# Altium footprint library ACTION_Connector.PcbLib: 123 footprints (part 2 of 8)
Each footprint in its own frame and in the unit in brackets; x right, y up, seen from the top. Pads: shape width x height; smd on the part's side, far side on the other; paste and mask are expansions set on the pad; w line width, h text height; cw(c..) or ccw(c..) is an arc to the next point about the centre after c.
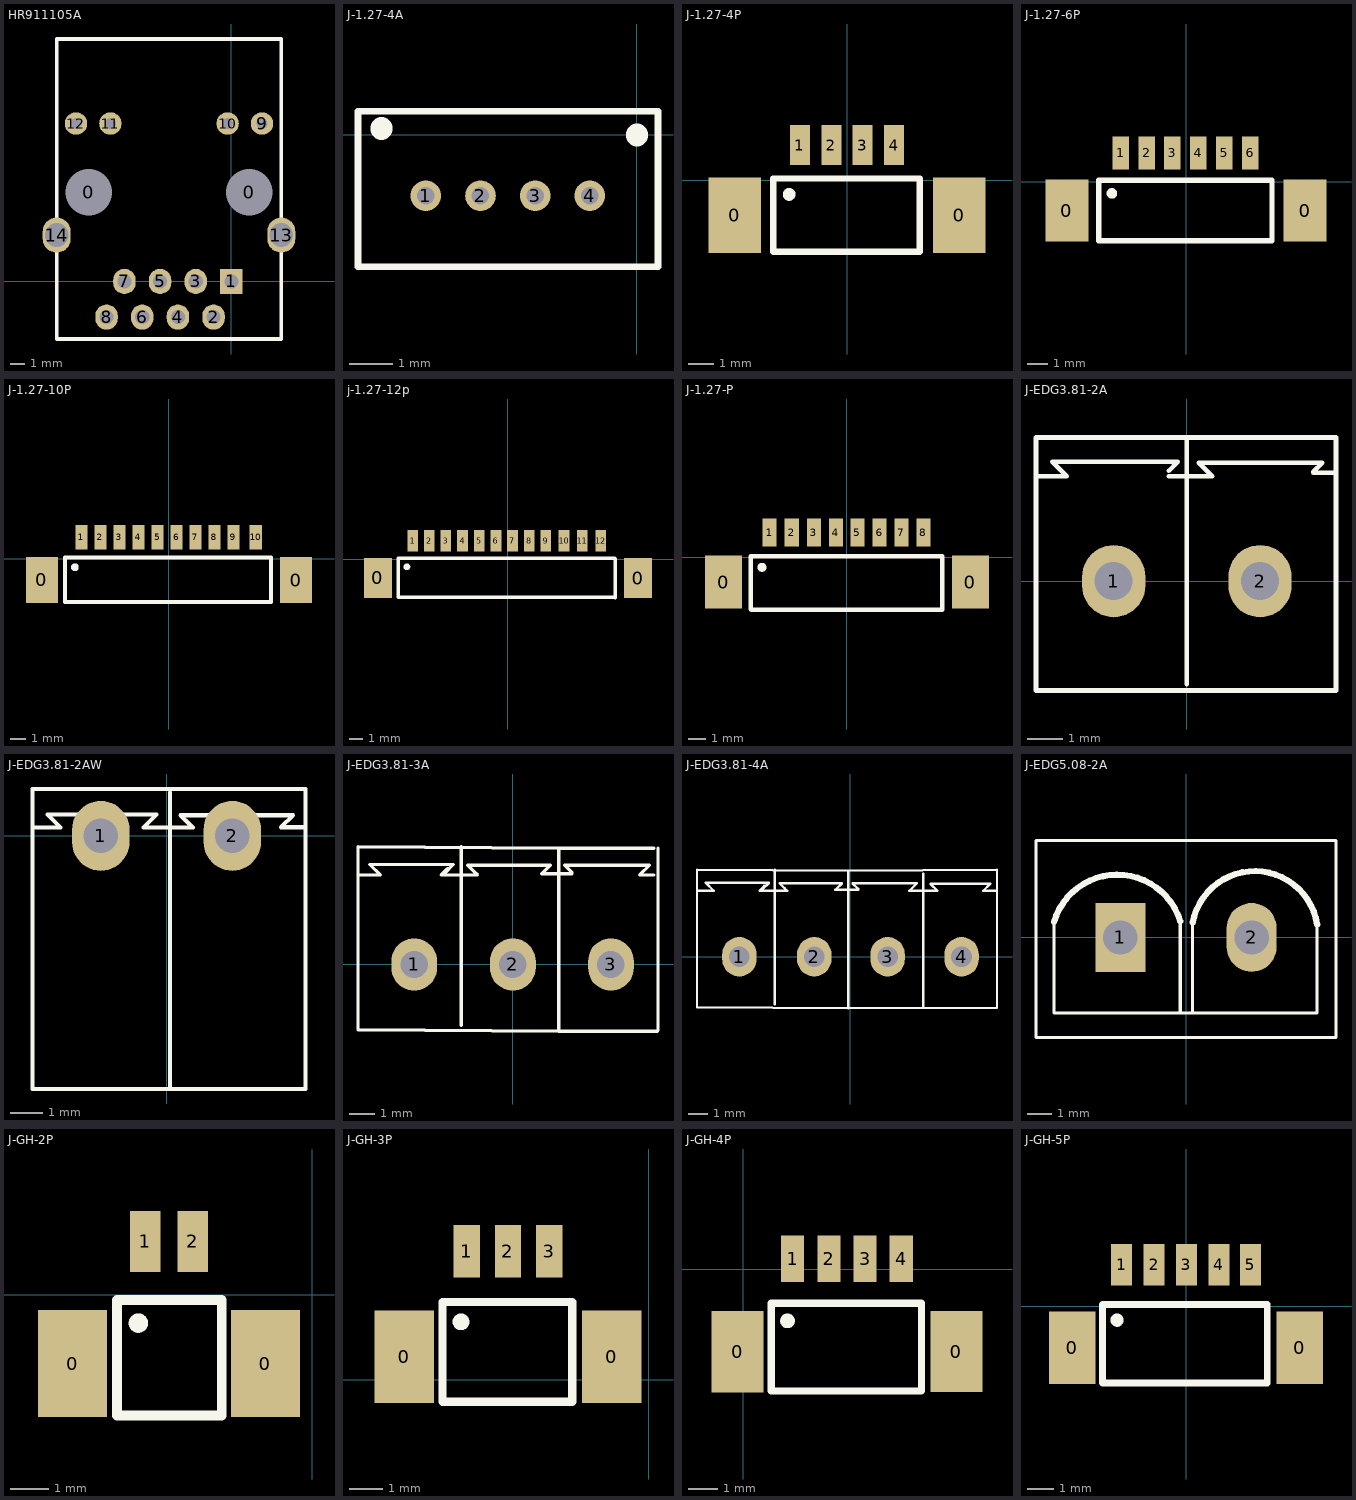
[diagram p1: the footprints below, top view; thin cyan lines are the x and y axes]

## HR911105A [mm]
pads (16):
  round 3.2 hole 3.3: 0(-10.16,6.35) 0(1.27,6.35)
  rect 1.6x1.8 hole 1: 1(0,0)
  oval 1.6x1.8 hole 1: 2(-1.27,-2.54) 3(-2.54,0) 4(-3.81,-2.54) 5(-5.08,0) 6(-6.35,-2.54) 7(-7.62,0) 8(-8.89,-2.54)
  round 1.6 hole 0.8: 9(2.18,11.25) 10(-0.27,11.25) 11(-8.62,11.25) 12(-11.07,11.25)
  oval 2x2.5 hole 1.7: 13(3.555,3.3) 14(-12.445,3.3)
Top Overlay:
  lines w0.254: 3.555,14.4 3.555,-4.1 ; -12.445,-4.1 3.555,-4.1 ; -12.445,-4.1 -12.445,14.4 -12.445,17.27 ; -12.445,-4.1 -12.445,17.27 ; -12.445,17.27 3.555,17.27 3.555,-4.1
3D body "HR911105A.STEP": height 2.53, standoff -13.97, extent -12.324,-4.223 3.556,17.177

## J-1.27-4A [mm]
pads (4):
  round 0.7 hole 0.4: 1(-4.826,-1.397) 2(-3.576,-1.397) 3(-2.326,-1.397) 4(-1.076,-1.397)
Top Overlay:
  lines w0.152: -6.375,-3.023 -6.375,0.533 0.483,0.533 0.483,-3.023 -6.375,-3.023
  lines w0.5: -5.842,0.127 -5.842,0.152 ; 0,-0.025 0,0

## J-1.27-4P [mm]
height 0.6
pads (6):
  rect 2.1x3 smd: 0(-4.475,-1.401) 0(4.475,-1.401)
  rect 0.8x1.6 smd: 1(-1.875,1.401) 2(-0.625,1.401) 3(0.625,1.401) 4(1.875,1.401)
Top Overlay:
  circle w0.254: c-2.305,-0.566 r0.127
  lines w0.254: -2.94,-2.852 2.902,-2.852 2.902,0.069 -2.94,0.069 -2.94,-2.852
3D body "装配体3(1).STEP": height 3.67, standoff 0.02, extent -4.993,-3.599 5.057,2.101

## J-1.27-6P [mm]
pads (8):
  rect 2.1x3 smd: 0(-5.759,-1.399) 0(5.759,-1.402)
  rect 0.8x1.6 smd: 1(-3.159,1.402) 2(-1.909,1.402) 3(-0.659,1.402) 4(0.591,1.402) 5(1.856,1.402) 6(3.106,1.402)
Top Overlay:
  circle w0.254: c-3.589,-0.564 r0.127
  lines w0.254: -4.224,-2.85 4.158,-2.85 4.158,0.071 -4.224,0.071 -4.224,-2.85
3D body "CH1.25-6P-SMD.STEP": height 3.5, standoff 0, extent -6.612,-3.468 6.038,1.732

## J-1.27-10P [mm]
pads (12):
  rect 2.1x3 smd: 0(-8.36,-1.4) 0(8.36,-1.403)
  rect 0.8x1.6 smd: 1(-5.76,1.401) 2(-4.51,1.401) 3(-3.26,1.401) 4(-2.01,1.401) 5(-0.754,1.403) 6(0.495,1.403) 7(1.733,1.401) 8(2.983,1.401) 9(4.233,1.401) 10(5.699,1.403)
Top Overlay:
  circle w0.254: c-6.19,-0.565 r0.127
  lines w0.254: 6.696,-2.851 -6.825,-2.851 -6.825,0.07 6.706,0.07 ; 6.709,-2.851 6.709,0.07

## j-1.27-12p [mm]
height 0.6
pads (14):
  rect 2.1x3 smd: 0(-9.76,-1.4) 0(9.76,-1.403)
  rect 0.8x1.6 smd: 1(-7.16,1.401) 2(-5.91,1.401) 3(-4.66,1.401) 4(-3.41,1.401) 5(-2.154,1.403) 6(-0.905,1.403) 7(0.333,1.401) 8(1.583,1.401) 9(2.833,1.401) 10(4.209,1.403) 11(5.583,1.401) 12(6.959,1.403)
Top Overlay:
  circle w0.254: c-7.59,-0.565 r0.127
  lines w0.254: 8.016,0.07 -8.225,0.07 -8.225,-2.851 8.036,-2.851 ; 8.046,-2.87 8.046,0.051

## J-1.27-P [mm]
pads (10):
  rect 2.1x3 smd: 0(-6.972,-1.399) 0(6.972,-1.402)
  rect 0.8x1.6 smd: 1(-4.371,1.402) 2(-3.121,1.402) 3(-1.871,1.402) 4(-0.622,1.402) 5(0.592,1.402) 6(1.842,1.402) 7(3.069,1.402) 8(4.319,1.402)
Top Overlay:
  circle w0.254: c-4.801,-0.564 r0.127
  lines w0.254: -5.436,-2.928 -5.436,0.069 5.371,0.069 5.371,-2.954 -5.411,-2.954 -5.436,-2.928
3D body "CH1.25-8P-SMD.STEP": height 3.5, standoff 0, extent -7.779,-3.699 7.371,1.501

## J-EDG3.81-2A [mil]
pads (2):
  oval 70x80 hole 42: 1(-81,0) 2(81,0)
Top Overlay:
  lines w5: -167,116 -133,116 -149,132 -10,132 -20,122 ; -20,116 16,116 28,116 23,121 13,131 150,131 140,121 140,120 164,120 ; 0,-114 0,159 ; -167,-121 165,-121 165,159 -167,159 -167,-121
3D body "小绿头2.STEP": height 354.33, standoff -137.8, extent -168,-122 166.65,158

## J-EDG3.81-2AW [mil]
height 68.9
pads (2):
  oval 70x85 hole 42: 1(-80,0) 2(80,0)
Top Overlay:
  lines w5: -163,10 -129,10 -145,26 -12,26 -28,10 32,10 27,15 17,25 154,25 139.5,10.5 167.5,10.5 ; 4,-305 4,53 ; -163,-308 169,-308 169,57 -163,57 -163,-308
3D body "66361.stp": height 287.4, standoff -102.36, extent -173.99,-305.55 180.74,56.66

## J-EDG3.81-3A [mil]
pads (3):
  oval 70x80 hole 42: 1(-151,0) 2(0,0) 3(150,0)
Top Overlay:
  lines w5: -237,137 -203,137 -219,153 -104,153 -91,153 -103,141 ; -97.22,146.78 -100.22,146.78 -110,137 -90,137 -54,137 -59,142 -69,152 57,152 44,139 90,139 90,141 79,152 209,152 194,137 216,137 ; -79,-93 -79,180 ; 70,141 70,142 ; 216,178 70,178 ; 221,-102 70,-102 ; 222,-101 222,172 222,178 ; 70,-102 70,178 ; 70,-102 -237,-100 -237,180 70,178
3D body "3-3.81修改.STEP": height 354.33, standoff -118.11, extent -250.99,-109.56 238.99,193

## J-EDG3.81-4A [mil]
pads (4):
  oval 70x80 hole 42: 1(-225.5,0) 2(-73.5,0) 3(75.5,0) 4(225.5,0)
Top Overlay:
  lines w5: -311.5,134 -277.5,134 -293.5,150 -178.5,150 -165.5,150 -177.5,138 ; -171.72,143.78 -174.72,143.78 -184.5,134 -164.5,134 -128.5,134 -133.5,139 -143.5,149 -17.5,149 -30.5,136 15.5,136 15.5,138 4.5,149 134.5,149 119.5,134 176.5,134 162.5,148 283.5,148 269.5,134 297.5,134 ; -153.5,-96 -153.5,177 ; -4.5,138 -4.5,139 ; 147.5,-104 147.5,169 ; -4.5,-105 -4.5,175 ; -4.5,-105 -311.5,-103 -311.5,177 -4.5,175 ; -4.5,-105 297.5,-103.31 297.5,176.69 -4.5,175

## J-EDG5.08-2A [mil]
pads (2):
  rect 80x110.24 hole 55: 1(-105,0)
  oval 80x110.24 hole 55: 2(105,0)
Top Overlay:
  lines w5: -211.19,24.76 -211.19,-120.81 209.88,-120.81 209.88,20.77 ; -9.19,-117.62 -9.19,26.02 ; 10.67,-120.81 10.67,23.92 ; -240,-160 -240,155 -30,155 240,155 240,-160 -240,-160
  lines w10: -211.19,24.76 cw(c-110,-5) -9.19,26.02 ; 10.67,23.92 cw(c110,5) 209.88,20.77
3D body "大绿头.STEP": height 354.33, standoff -39.37, extent -234.22,-157.96 238.22,157

## J-GH-2P [mm]
pads (4):
  rect 1.8x2.8 smd: 0(-6.27,-1.8) 0(-1.221,-1.8)
  rect 0.8x1.6 smd: 1(-4.371,1.402) 2(-3.121,1.402)
Top Overlay:
  circle w0.254: c-4.547,-0.737 r0.127
  lines w0.254: -5.105,-3.157 -2.362,-3.157 -2.362,-0.134 -5.105,-0.134 -5.105,-3.157
3D body "SM02B-GHS-TB.stp": height 4.25, standoff -0.05, extent -6.639,-3.224 -0.889,1.626

## J-GH-3P [mm]
pads (5):
  rect 1.8x2.8 smd: 0(-7.413,0.689) 0(-1.114,0.691)
  rect 0.8x1.6 smd: 1(-5.514,3.891) 2(-4.264,3.891) 3(-3.014,3.891)
Top Overlay:
  circle w0.254: c-5.69,1.753 r0.127
  lines w0.254: -6.248,-0.668 -6.248,2.355 -2.311,2.355 -2.311,-0.668 -6.248,-0.668

## J-GH-4P [mm]
pads (6):
  rect 1.8x2.8 smd: 0(-0.199,-2.841) 0(7.349,-2.839)
  rect 0.8x1.6 smd: 1(1.699,0.361) 2(2.949,0.361) 3(4.199,0.361) 4(5.449,0.361)
Top Overlay:
  circle w0.254: c1.524,-1.778 r0.127
  lines w0.254: 0.965,-4.198 0.965,-1.176 6.147,-1.176 6.147,-4.198 0.965,-4.198
3D body "SM04B-GHS-TB.stp": height 4.25, standoff -0.05, extent -0.503,-4.266 7.747,0.584

## J-GH-5P [mm]
pads (7):
  rect 1.8x2.8 smd: 0(-4.381,-1.601) 0(4.381,-1.599)
  rect 0.8x1.6 smd: 1(-2.483,1.601) 2(-1.233,1.601) 3(0.017,1.601) 4(1.267,1.601) 5(2.481,1.601)
Top Overlay:
  circle w0.254: c-2.658,-0.538 r0.127
  lines w0.254: -3.217,-2.958 -3.217,0.065 3.133,0.065 3.133,-2.958 -3.217,-2.958
3D body "SM05B-GHS-TB.stp": height 4.35, standoff 0.05, extent -4.724,-3.015 4.776,1.835